# Altium footprint library Printing.PcbLib: 48 footprints (part 1 of 3)
Each footprint in its own frame and in the unit in brackets; x right, y up, seen from the top. Pads: shape width x height; smd on the part's side, far side on the other; paste and mask are expansions set on the pad; w line width, h text height; cw(c..) or ccw(c..) is an arc to the next point about the centre after c.
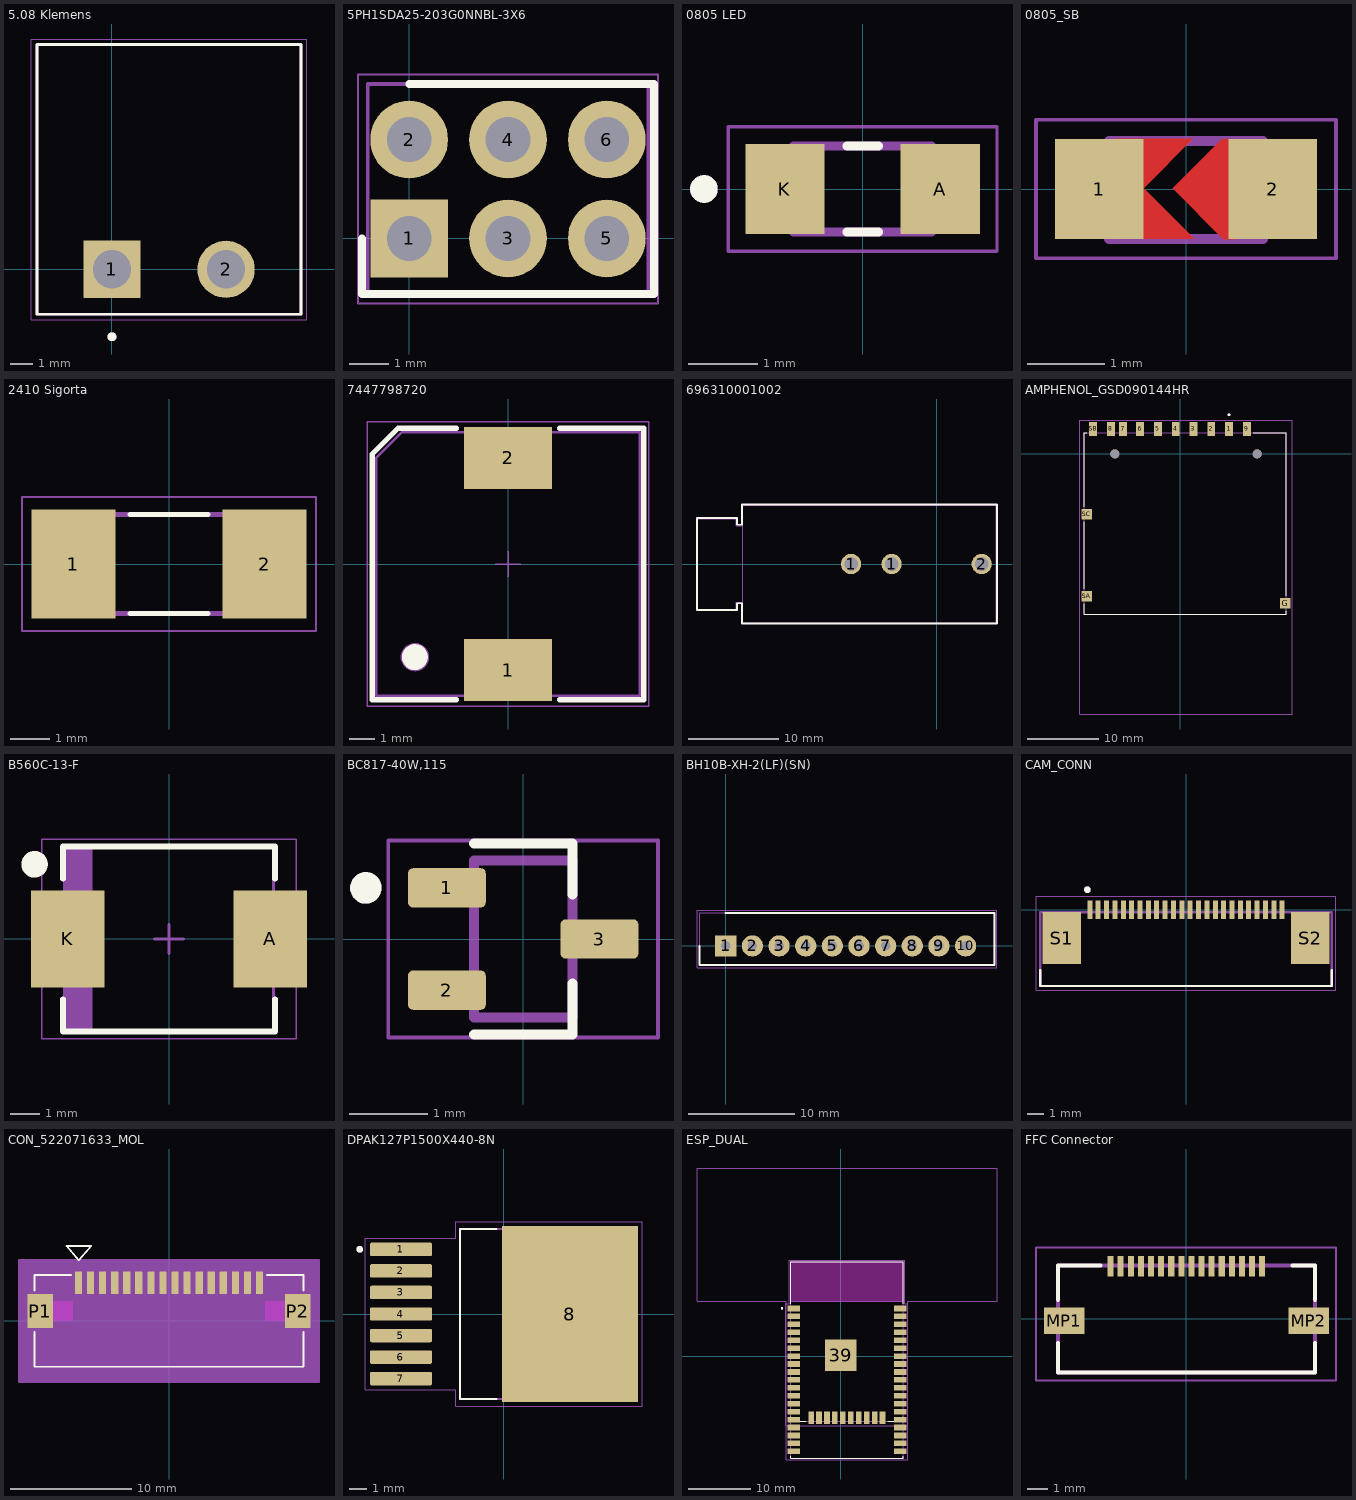
[diagram p0: the footprints below, top view; thin cyan lines are the x and y axes]

## 5.08 Klemens [mm]
pads (2):
  rect 2.55x2.55 / inner round 2.55 / far side rect 2.55x2.55 hole 1.7: 1(0,0)
  round 2.55 hole 1.7: 2(5.08,0)
Top Overlay:
  circle w0.2: c0,-3 r0.1
  lines w0.127: -3.34,-2 -3.34,10 8.42,10 8.42,-2 -3.34,-2
Mechanical 13:
  circle w0.2: c0,-3 r0.1
  lines w0.127: -3.34,-2 -3.34,10 8.42,10 8.42,-2 -3.34,-2
Mechanical 15:
  lines w0.05: -3.59,-2.25 8.67,-2.25 8.67,10.25 -3.59,10.25 -3.59,-2.25
3D body "CUI_DEVICES_TBP01R1-508-02OR.step": height 8.5, standoff -4, extent -3.378,-1.967 8.382,10.033

## 5PH1SDA25-203G0NNBL-3X6 [mm]
pads (6):
  rect 2x2 hole 1.15: 1(0,0)
  round 2 hole 1.15: 2(0,2.54) 3(2.54,0) 4(2.54,2.54) 5(5.08,0) 6(5.08,2.54)
Top Overlay:
  lines w0.2: -1.212,0 -1.212,-1.425 6.293,-1.425 6.293,3.965 0,3.965
Mechanical 13:
  lines w0.1: -1.065,-1.425 -1.065,3.965 6.145,3.965 6.145,-1.425 -1.065,-1.425
Mechanical 15:
  lines w0.05: -1.315,-1.675 -1.315,4.215 6.395,4.215 6.395,-1.675 -1.315,-1.675
3D body "5-146257-3.stp": height 8.12, standoff -3.05, extent -1.067,-1.168 6.147,3.708

## 0805 LED [mm]
pads (2):
  rect 1.15x1.3 smd: A(1.125,0) K(-1.125,0)
Top Overlay:
  circle w0.2: c-2.3,0 r0.1
  lines w0.127: -0.23,-0.625 0.23,-0.625 ; -0.23,0.625 0.23,0.625
Mechanical 13:
  circle w0.2: c-2.3,0 r0.1
  lines w0.127: -1,-0.625 -1,0.625 1,0.625 1,-0.625 -1,-0.625
Mechanical 15:
  lines w0.05: -1.95,-0.9 -1.95,0.9 1.95,0.9 1.95,-0.9 -1.95,-0.9
3D body "step_temp.STEP": height 0.73, standoff 0, extent -1.003,-0.622 1.003,0.622

## 0805_SB [mm]
pads (2):
  rect 1.15x1.3 smd: 1(-1.125,0) 2(1.125,0)
Top Layer:
  region: 0.657,0.65 0.466,0.65 -0.173,0.011 0.487,-0.651 0.656,-0.651
  region: -0.91,-0.65 0.11,-0.65 -0.55,0.01 0.09,0.65 -0.91,0.65
Top Solder:
  region: 0.517,0.752 0.428,0.752 -0.313,0.011 0.449,-0.751 0.517,-0.751
  region: -0.77,-0.75 0.35,-0.75 -0.41,0.01 0.33,0.75 -0.77,0.75
Mechanical 13:
  lines w0.127: -1,-0.65 1,-0.65 1,0.625 -1,0.625 -1,-0.65
Mechanical 15:
  lines w0.05: -1.95,-0.9 1.95,-0.9 1.95,0.9 -1.95,0.9 -1.95,-0.9

## 2410 Sigorta [mm]
pads (2):
  rect 2.15x2.8 smd: 1(-2.455,0) 2(2.455,0)
Top Overlay:
  lines w0.127: -1,-1.27 1,-1.27 ; -1,1.27 1,1.27
Mechanical 13:
  lines w0.127: -3.05,-1.27 -3.05,1.27 3.05,1.27 3.05,-1.27 -3.05,-1.27
Mechanical 15:
  lines w0.05: -3.78,-1.72 3.78,-1.72 3.78,1.72 -3.78,1.72 -3.78,-1.72
3D body "0679L4000-05.STEP": height 2.79, standoff 0, extent -3.05,-1.27 3.05,1.27

## 7447798720 [mm]
pads (2):
  rect 3.4x2.4 smd: 1(0,-4.1) 2(0,4.1)
Top Overlay:
  circle w0.5: c-3.6,-3.6 r0.25
  lines w0.2: -2,-5.25 -5.25,-5.25 -5.25,4.25 -4.25,5.25 -2,5.25 ; 2,-5.25 5.25,-5.25 5.25,5.25 2,5.25
Top 3D Body:
  circle w0.1: c-3.6,-3.6 r0.5
  lines w0.1: -5.1,-5.1 -5.1,4.1 -4.1,5.1 5.1,5.1 5.1,-5.1 -5.1,-5.1
Top Designator:
  lines w0.05: -0.5,0 0.5,0 ; 0,-0.5 0,0.5 ; -5.45,-5.5 5.45,-5.5 5.45,5.5 -5.45,5.5 -5.45,-5.5
Top Component Outline:
  circle w0.1: c-3.6,-3.6 r0.5
  lines w0.1: -5.1,-5.1 -5.1,4.1 -4.1,5.1 5.1,5.1 5.1,-5.1 -5.1,-5.1
3D body "7447797xxx.stp": height 4.5, standoff 0, extent -5.1,-5.1 5.1,5.1

## 696310001002 [mm]
pads (3):
  round 2.25 hole 1.5: 1(-9.5,0) 1(-5,0) 2(5,0)
Top Overlay:
  lines w0.2: -26.6,-5.1 -26.6,5.1 -22.15,5.1 -22.15,4.35 -21.6,4.35 -21.6,6.6 6.7,6.6 6.7,-6.6 -21.6,-6.6 -21.6,-4.35 -22.15,-4.35 -22.15,-5.1 -26.6,-5.1
Mechanical 13:
  lines w0.1: -21.5,-4.25 -22.25,-4.25 -22.25,-5 -26.5,-5 -26.5,5 -22.25,5 -22.25,4.25 -21.5,4.25 ; -21.5,4.25 -21.5,6.5 6.6,6.5 6.6,-6.5 -21.5,-6.5 -21.5,4.25
3D body "696310001002.stp": height 12.5, standoff -4.4, extent -26.293,-6.475 6.807,6.525

## AMPHENOL_GSD090144HR [mm]
height 2.75
pads (15):
  rect 1.1x2 smd: 1(6.85,3.5) 2(4.35,3.5) 3(1.85,3.5) 4(-0.65,3.5) 5(-3.15,3.5) 6(-5.65,3.5) 7(-8.05,3.5) 8(-9.75,3.5) 9(9.35,3.5) SB(-12.25,3.5)
  rect 1.5x1.5 smd: G(14.75,-21) SA(-13.15,-20) SC(-13.15,-8.5)
  round 1.25 hole 1.25 unplated: ""(-9.2,0) ""(10.8,0)
Top Overlay:
  circle w0.2: c6.85,5.5 r0.1
  lines w0.127: -13.5,-21.07 -13.5,-22.5 14.9,-22.5 14.9,-22.07 ; -13.5,-18.93 -13.5,-9.57 ; -13.5,-7.43 -13.5,3 -13.12,3 ; 10.22,3 14.9,3 14.9,-19.93
Mechanical 13:
  circle w0.2: c6.85,5.5 r0.1
  lines w0.127: -13.5,-22.5 -13.5,3 14.9,3 14.9,-22.5 -13.5,-22.5
Mechanical 15:
  lines w0.05: -14.15,-36.55 15.75,-36.55 15.75,4.75 -14.15,4.75 -14.15,-36.55
3D body "step_temp.STEP": height 4.55, standoff -0.6, extent -13.538,-22.627 15.062,3.874

## B560C-13-F [mm]
pads (2):
  rect 2.5x3.3 smd: A(3.45,0) K(-3.45,0)
Top Overlay:
  circle w0.5: c-4.572,2.54 r0.2
  lines w0.2: -3.6,-2.05 -3.6,-3.15 3.6,-3.15 3.6,-2.05 ; -3.6,2.05 -3.6,3.15 3.6,3.15 3.6,2.05
Mechanical 13:
  rectangle: -3.555,-3.11 -2.599,3.11
  lines w0.1: -3.555,-3.11 3.555,-3.11 3.555,3.11 -3.555,3.11 -3.555,-3.11
Mechanical 15:
  lines w0.05: -4.325,-3.4 4.325,-3.4 4.325,3.4 -4.325,3.4 -4.325,-3.4
  lines w0.1: -0.5,0 0.5,0 ; 0,-0.5 0,0.5
3D body "SMC(DO-214AB).step": height 2.62, standoff 0, extent -3.775,-3.11 3.775,3.11

## BC817-40W,115 [mm]
pads (3):
  rrect25% 0.99x0.5 smd: 1(-0.97,0.65) 2(-0.97,-0.65) 3(0.97,0)
Top Overlay:
  circle w0.2: c-2,0.65 r0.1
  lines w0.127: -0.625,-1.214 0.625,-1.214 0.625,-0.564 ; -0.625,1.214 0.625,1.214 0.625,0.564
Mechanical 13:
  circle w0.2: c-2,0.65 r0.1
  lines w0.127: -0.625,-1 0.625,-1 0.625,1 -0.625,1 -0.625,-1
Mechanical 15:
  lines w0.05: -1.715,-1.25 1.715,-1.25 1.715,1.25 -1.715,1.25 -1.715,-1.25
3D body "BC817W.STEP": height 1.11, standoff 0.01, extent -1.05,-1 1.05,1

## BH10B-XH-2(LF)(SN) [mm]
pads (10):
  rect 2x2 hole 0.9: 1(0,0)
  round 2 hole 0.9: 2(2.5,0) 3(5,0) 4(7.5,0) 5(10,0) 6(12.5,0) 7(15,0) 8(17.5,0) 9(20,0) 10(22.5,0)
Top Overlay:
  lines w0.2: -2.45,0 -2.45,-1.8 25.2,-1.8 25.2,3.1 0,3.1
Mechanical 13:
  lines w0.1: -2.45,-1.8 -2.45,3.1 25.2,3.1 25.2,-1.8 -2.45,-1.8
Mechanical 15:
  lines w0.05: -2.7,-2.05 -2.7,3.35 25.45,3.35 25.45,-2.05 -2.7,-2.05
3D body "22-03-5105.stp": height 5.86, standoff -3.54, extent -2.46,-1.79 24.94,3.11

## CAM_CONN [mm]
pads (26):
  rect 0.3x1.1 smd: 1(-5.75,0) 2(-5.25,0) 3(-4.75,0) 4(-4.25,0) 5(-3.75,0) 6(-3.25,0) 7(-2.75,0) 8(-2.25,0) 9(-1.75,0) 10(-1.25,0) 11(-0.75,0) 12(-0.25,0) 13(0.25,0) 14(0.75,0) 15(1.25,0) 16(1.75,0) 17(2.25,0) 18(2.75,0) 19(3.25,0) 20(3.75,0) 21(4.25,0) 22(4.75,0) 23(5.25,0) 24(5.75,0)
  rect 2.3x3.1 smd: S1(-7.42,-1.7) S2(7.42,-1.7)
Top Overlay:
  circle w0.2: c-5.9,1.2 r0.1
  lines w0.127: -8.715,-3.6 -8.715,-4.55 8.715,-4.55 8.715,-3.6
Mechanical 13:
  circle w0.2: c-5.9,1.2 r0.1
  lines w0.127: -8.715,-4.55 -8.715,-0.15 8.715,-0.15 8.715,-4.55 -8.715,-4.55
Mechanical 15:
  lines w0.05: -8.965,-4.8 -8.965,0.8 8.965,0.8 8.965,-4.8 -8.965,-4.8
3D body "2-1734592-4.stp": height 2.05, standoff 0, extent -8.73,-4.555 8.7,0.555

## CON_522071633_MOL [mm]
pads (18):
  rect 0.6x1.9 smd paste+0 mask+0.076: 1(-7.5,3.15) 2(-6.5,3.15) 3(-5.5,3.15) 4(-4.5,3.15) 5(-3.5,3.15) 6(-2.5,3.15) 7(-1.5,3.15) 8(-0.5,3.15) 9(0.5,3.15) 10(1.5,3.15) 11(2.5,3.15) 12(3.5,3.15) 13(4.5,3.15) 14(5.5,3.15) 15(6.5,3.15) 16(7.5,3.15)
  rect 2.1x2.8 smd paste+0 mask+0.076: P1(-10.65,0.8) P2(10.65,0.8)
Top Overlay:
  lines w0.152: -11.15,-0.918 -11.15,-3.8 11.15,-3.8 11.15,-0.918 ; -11.15,2.517 -11.15,3.8 -8.117,3.8 ; 8.118,3.8 11.15,3.8 11.15,2.517 ; -8.483,6.198 -6.451,6.198 -7.467,5.004 -8.483,6.198
Keep-Out Layer:
  region: -7.95,0 -7.95,1.6 -9.6,1.6 -9.6,0
  region: 7.95,0 7.95,1.6 9.6,1.6 9.6,0
Mechanical 13:
  lines w0.127: -11.15,-3.8 11.15,-3.8 11.15,3.8 -11.15,3.8 -11.15,-3.8 ; -8.483,6.198 -6.451,6.198 -7.467,5.004 -8.483,6.198
Mechanical 15:
  region: 12.42,5.07 -12.42,5.07 -12.42,-5.07 12.42,-5.07
  lines w0.127: -12.42,-5.07 -12.42,5.07 12.42,5.07 12.42,-5.07 -12.42,-5.07
3D body "522071633.stp": height 2.75, standoff 0.05, extent -11.023,-3.435 11.277,4.165

## DPAK127P1500X440-8N [mm]
height 4.4
pads (8):
  rrect25% 3.67x0.79 smd: 1(-6.07,3.81) 2(-6.07,2.54) 3(-6.07,1.27) 4(-6.07,0) 5(-6.07,-1.27) 6(-6.07,-2.54) 7(-6.07,-3.81)
  rect 8.04x10.37 smd paste-6: 8(3.89,0)
Top Overlay:
  circle w0.2: c-8.5,3.81 r0.1
  lines w0.127: -0.444,-5 -2.59,-5 -2.59,5 -0.444,5
Top Paste:
  region: 2,-4.845 0.42,-4.845 0.42,-3.435 2,-3.435
  region: 2,-2.775 0.42,-2.775 0.42,-1.365 2,-1.365
  region: 2,-0.705 0.42,-0.705 0.42,0.705 2,0.705
  region: 2,1.365 0.42,1.365 0.42,2.775 2,2.775
  region: 2,3.435 0.42,3.435 0.42,4.845 2,4.845
  region: 7.36,-4.845 5.78,-4.845 5.78,-3.435 7.36,-3.435
  region: 7.36,-2.775 5.78,-2.775 5.78,-1.365 7.36,-1.365
  region: 7.36,-0.705 5.78,-0.705 5.78,0.705 7.36,0.705
  region: 7.36,1.365 5.78,1.365 5.78,2.775 7.36,2.775
  region: 7.36,3.435 5.78,3.435 5.78,4.845 7.36,4.845
  region: 4.68,-4.845 3.1,-4.845 3.1,-3.435 4.68,-3.435
  region: 4.68,-2.775 3.1,-2.775 3.1,-1.365 4.68,-1.365
  region: 4.68,3.435 3.1,3.435 3.1,4.845 4.68,4.845
  region: 4.68,1.365 3.1,1.365 3.1,2.775 4.68,2.775
  region: 4.68,-0.705 3.1,-0.705 3.1,0.705 4.68,0.705
Mechanical 13:
  circle w0.2: c-8.5,3.81 r0.1
  lines w0.127: -2.59,-5 -2.59,5 6.67,5 6.67,-5 -2.59,-5
Mechanical 15:
  lines w0.05: -8.16,-4.46 -8.16,4.46 -2.84,4.46 -2.84,5.435 8.16,5.435 8.16,-5.435 -2.84,-5.435 -2.84,-4.46 -8.16,-4.46
3D body "step_temp.STEP": height 4.4, standoff -0.1, extent -7.209,-5 7.511,5

## ESP_DUAL [mm]
pads (49):
  rect 2x0.9 smd: 1(-7.509,7.676) 2(-7.509,6.406) 3(-7.509,5.136) 4(-7.509,3.866) 5(-7.509,2.596) 6(-7.509,1.326) 7(-7.509,0.056) 8(-7.509,-1.214) 9(-7.509,-2.484) 10(-7.509,-3.754) 11(-7.509,-5.024) 12(-7.509,-6.294) 13(-7.509,-7.564) 14(-7.509,-8.834) 15(-7.509,-10.104) 16(-7.509,-11.374) 17(-7.509,-12.644) 18(-7.509,-13.914) 19(-7.509,-15.184) 20(9.491,-15.184) 21(9.491,-13.914) 22(9.491,-12.644) 23(9.491,-11.374) 24(9.491,-10.104) 25(9.491,-8.834) 26(9.491,-7.564) 27(9.491,-6.294) 28(9.491,-5.024) 29(9.491,-3.754) 30(9.491,-2.484) 31(9.491,-1.214) 32(9.491,0.056) 33(9.491,1.326) 34(9.491,2.596) 35(9.491,3.866) 36(9.491,5.136) 37(9.491,6.406) 38(9.491,7.676)
  rect 0.9x2 smd: 15(-4.75,-9.837) 16(-3.48,-9.837) 17(-2.21,-9.837) 18(-0.94,-9.837) 19(0.33,-9.837) 20(1.6,-9.837) 21(2.87,-9.837) 22(4.14,-9.837) 23(5.41,-9.837) 24(6.68,-9.837)
  rect 5x5 smd paste-0.92: 39(-0.009,0.176)
Top Overlay:
  circle w0.2: c-9.409,7.716 r0.1
  lines w0.127: -8.035,-9.687 -8.035,-10.337 -5.585,-10.337 ; -8.035,8.663 -8.035,15.163 9.965,15.163 9.965,8.663 ; -8.009,-15.944 -8.009,-16.284 9.991,-16.284 9.991,-15.944 ; -8.009,8.446 -8.009,15.116 9.991,15.116 9.991,8.446 ; 7.515,-10.337 9.965,-10.337 9.965,-9.687
Keep-Out Layer:
  region: 9.965,8.863 -8.035,8.863 -8.035,15.163 9.965,15.163
Mechanical 13:
  circle w0.2: c-9.409,7.716 r0.1
  lines w0.127: -8.035,8.863 9.965,8.863 ; -8.035,8.863 -8.035,15.163 9.965,15.163 9.965,8.863 ; -8.035,8.863 -8.035,-10.337 9.965,-10.337 9.965,8.863 ; -8.009,8.816 -8.009,-16.284 9.991,-16.284 9.991,8.816 ; -8.009,8.816 -8.009,15.116 9.991,15.116 9.991,8.816 ; -8.009,8.816 9.991,8.816
  text "ANTENNA" at -2.709,11.316 h1.27
Mechanical 15:
  lines w0.05: -23.009,8.816 -8.759,8.816 -8.759,-16.534 10.741,-16.534 10.741,8.816 24.991,8.816 24.991,30.116 -23.009,30.116 -23.009,8.816 ; -8.785,-11.087 -8.785,8.413 -8.285,8.413 -8.285,15.413 10.215,15.413 10.215,8.413 10.715,8.413 10.715,-11.087 -8.785,-11.087
3D body "step_temp.STEP": height 3.2, standoff 0, extent -8.035,-10.337 9.965,15.163

## FFC Connector [mm]
pads (18):
  rect 0.3x1 smd: 1(-3.75,2.6) 2(-3.25,2.6) 3(-2.75,2.6) 4(-2.25,2.6) 5(-1.75,2.6) 6(-1.25,2.6) 7(-0.75,2.6) 8(-0.25,2.6) 9(0.25,2.6) 10(0.75,2.6) 11(1.25,2.6) 12(1.75,2.6) 13(2.25,2.6) 14(2.75,2.6) 15(3.25,2.6) 16(3.75,2.6)
  rect 2x1.3 smd: MP1(-6.05,-0.1) MP2(6.05,-0.1)
Top Overlay:
  lines w0.2: -6.35,-1.197 -6.35,-2.65 6.35,-2.65 6.35,-1.197 ; -6.35,0.945 -6.35,2.65 -4.252,2.65 ; 5.252,2.65 6.35,2.65 6.35,0.945
Mechanical 13:
  lines w0.2: -6.35,-2.65 6.35,-2.65 6.35,2.65 -6.35,2.65 -6.35,-2.65
Mechanical 15:
  lines w0.1: -7.44,-3.05 7.4,-3.05 7.4,3.53 -7.44,3.53 -7.44,-3.05
3D body "505110-1692.stp": height 1.9, standoff 0, extent -6.75,-2.53 6.75,2.77